# Altium footprint library Lib_001.PcbLib: 429 footprints (part 5 of 28)
Each footprint in its own frame and in the unit in brackets; x right, y up, seen from the top. Pads: shape width x height; smd on the part's side, far side on the other; paste and mask are expansions set on the pad; w line width, h text height; cw(c..) or ccw(c..) is an arc to the next point about the centre after c.
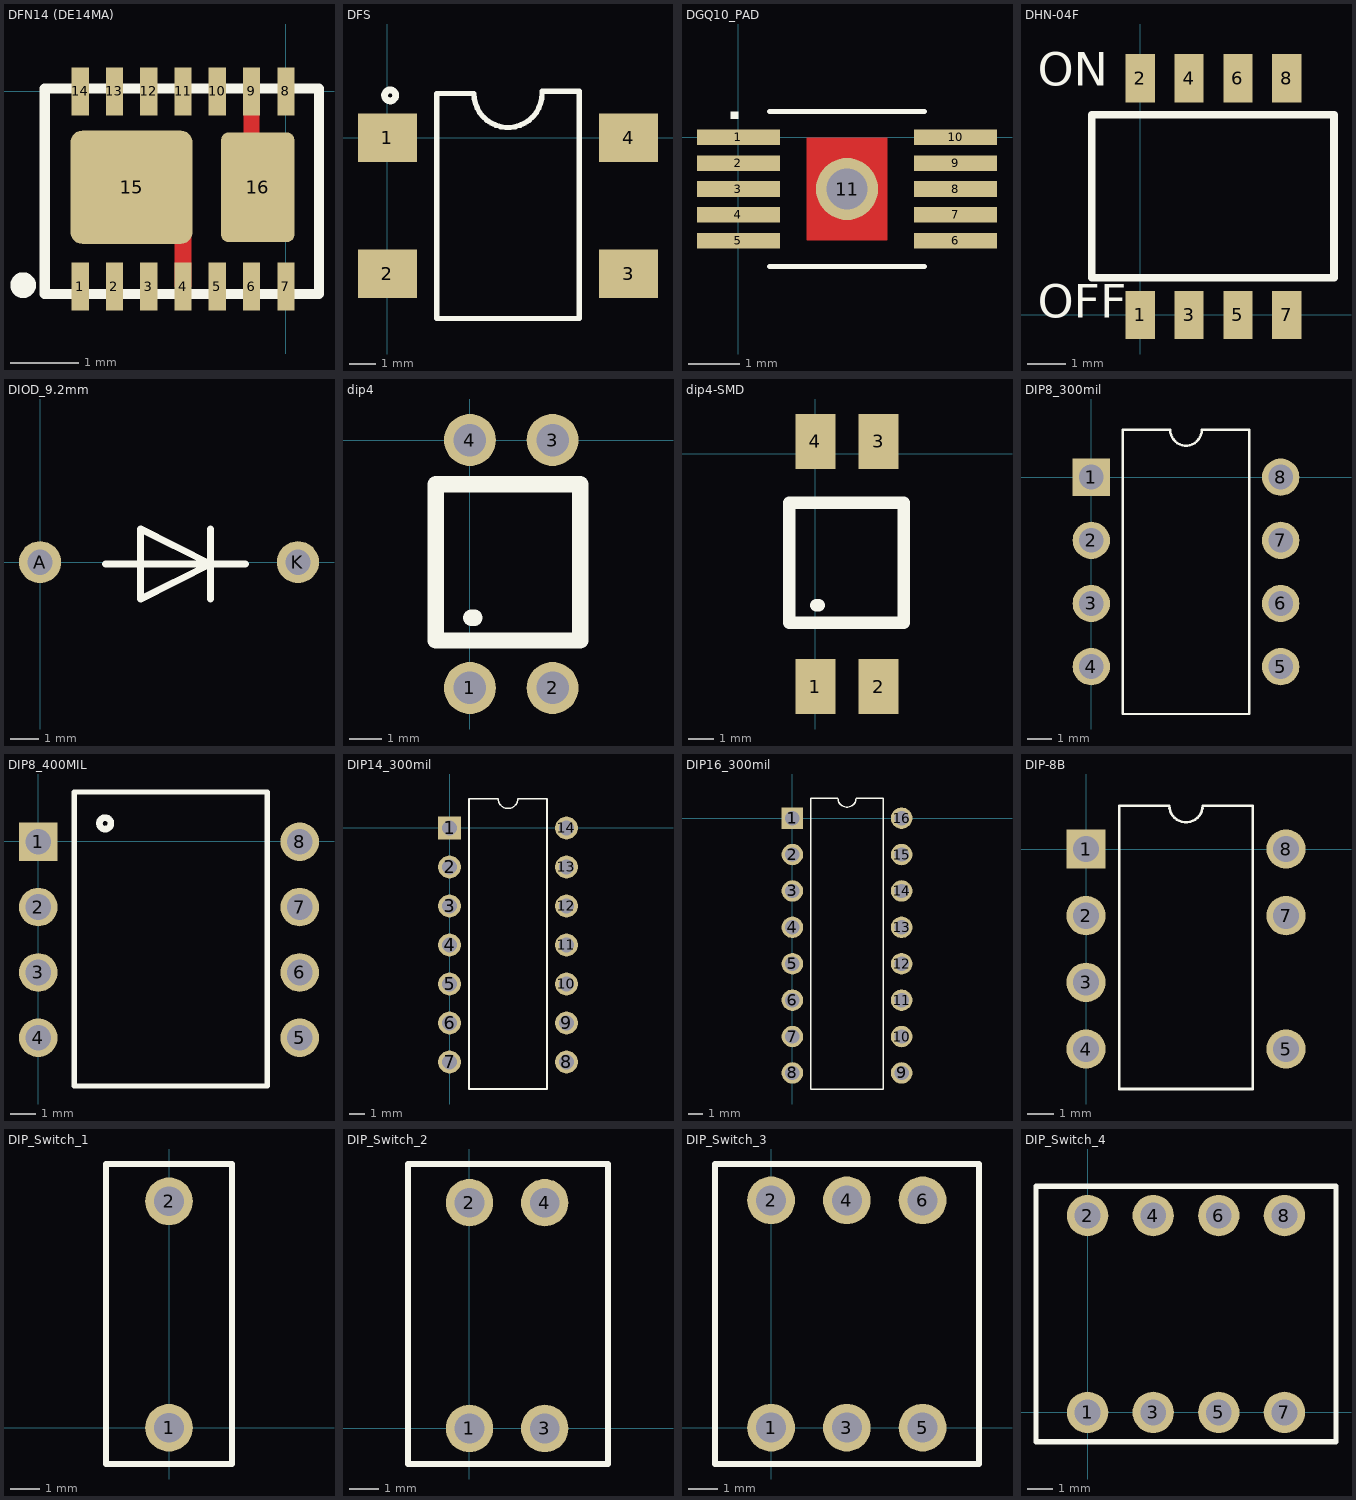
[diagram p4: the footprints below, top view; thin cyan lines are the x and y axes]

## DFN14 (DE14MA) [mm] "DE14MA PACKAGE  14-LEAD (4mm   ?   3mm) PLASTIC DFN"
pads (16):
  rect 0.25x0.7 smd: 1(-3,-2.85) 2(-2.5,-2.85) 3(-2,-2.85) 4(-1.5,-2.85) 5(-1,-2.85) 6(-0.5,-2.85) 7(0,-2.85) 8(0,0) 9(-0.5,0) 10(-1,0) 11(-1.5,0) 12(-2,0) 13(-2.5,0) 14(-3,0)
  rrect20% 1.78x1.65 smd paste+0: 15(-2.251,-1.4)
  rrect20% 1.07x1.6 smd: 16(-0.41,-1.4)
Top Layer:
  region: -0.84,-0.62 -0.611,-0.62 -0.611,0 -0.389,0 -0.389,-0.788 -0.844,-0.788 -0.844,-0.771
  region: -1.381,-2.85 -1.381,-1.898 -1.719,-1.898 -1.719,-2.151 -1.617,-2.151 -1.617,-2.85
Top Overlay:
  lines w0.15: -3.516,-2.958 0.484,-2.958 0.484,0.042 -3.516,0.042 -3.516,-2.958
  lines w0.254: -3.878,-2.788 ccw(c-3.833,-2.828) -3.868,-2.779
3D body: height 0.5, standoff 0, extent -3.126,-0.137 -2.876,0.043
3D body: height 0.5, standoff 0, extent -2.625,-0.137 -2.375,0.043
3D body: height 0.5, standoff 0, extent -2.126,-0.137 -1.876,0.043
3D body: height 0.5, standoff 0, extent -1.625,-0.137 -1.375,0.043
3D body: height 0.5, standoff 0, extent -1.124,-0.137 -0.874,0.043
3D body: height 0.5, standoff 0, extent -0.624,-0.137 -0.374,0.043
3D body: height 0.5, standoff 0, extent -0.126,-0.137 0.124,0.043
3D body: height 0.5, standoff 0, extent -0.125,-2.967 0.125,-2.787
3D body: height 0.5, standoff 0, extent -0.625,-2.967 -0.375,-2.787
3D body: height 0.5, standoff 0, extent -1.125,-2.966 -0.875,-2.786
3D body: height 0.5, standoff 0, extent -1.625,-2.967 -1.375,-2.787
3D body: height 0.5, standoff 0, extent -2.125,-2.967 -1.875,-2.787
3D body: height 0.5, standoff 0, extent -2.625,-2.967 -2.375,-2.787
3D body: height 0.5, standoff 0, extent -3.125,-2.967 -2.875,-2.787
3D body: height 1, standoff 0, extent -3.516,-2.958 0.484,0.042

## DFS [mm] "Bridge Rectifiers"
pads (4):
  rect 2.2x1.8 smd: 1(0,0) 2(0,-5.08) 3(9,-5.08) 4(9,0)
Top Overlay:
  lines w0.2: 5.77,1.65 cw(c4.5,1.65) 3.23,1.65 1.835,1.65 1.835,-6.75 7.165,-6.75 7.165,1.73 5.77,1.73
  lines w0.254: 0.306,1.603 ccw(c0.1,1.58) 0.307,1.57
3D body "User Library-DFS.STEP": height 2.61, standoff 0.02, extent -0.62,-6.64 9.68,1.56

## DGQ10_PAD [mm] "MSOP 10 PowerPad"
pads (11):
  rect 1.6x0.3 smd: 1(0,0) 2(0,-0.5) 3(0,-1) 4(0,-1.5) 5(0,-2) 6(4.2,-2) 7(4.2,-1.5) 8(4.2,-1) 9(4.2,-0.5) 10(4.2,0)
  round 1.2 hole 0.8: 11(2.1,-1)
Top Layer:
  rectangle: 1.32,-2 2.88,0
Top Overlay:
  rectangle: -0.15,0.35 0,0.5
  lines w0.1: 0.6,-2.5 3.6,-2.5 ; 0.6,0.5 3.6,0.5
Top Solder:
  rectangle: 1.22,-2.1 2.98,0.1
3D body: height 1.1, standoff 0, extent 0.6,-2.5 3.6,0.5

## DHN-04F [mm]
pads (8):
  rect 0.76x1.25 smd: 1(0,0) 2(0,6.15) 3(1.27,0) 4(1.27,6.15) 5(2.54,0) 6(2.54,6.15) 7(3.81,0) 8(3.81,6.15)
Top Overlay:
  lines w0.2: -1.262,0.964 5.038,0.964 5.038,5.204 -1.262,5.204 -1.262,0.964
  text "ON" at -2.656,5.671 h1.5
  text "OFF" at -2.656,-0.36 h1.5
3D body "User Library-DHN-04F.STEP": height 1.6, standoff 0, extent -1.25,-0.25 5.05,6.45

## DIOD_9.2mm [mm]
pads (2):
  round 1.5 hole 0.9: A(0,0) K(9.2,0)
Top Overlay:
  lines w0.254: 2.33,-0.065 7.33,-0.065 ; 6.08,-1.315 6.08,1.185 ; 3.58,-1.315 3.58,1.185 6.08,-0.065 3.58,-1.315
3D body "User Library-DO-35G-40D.step": height 1.82, standoff -2, extent -0.755,-0.901 9.955,0.901

## dip4 [mm]
pads (4):
  round 1.6 hole 1: 1(0,-7.62) 2(2.54,-7.62) 3(2.54,0) 4(0,0)
Top Overlay:
  lines w0.5: 0.04,-5.46 0.14,-5.46 ; -1.05,-6.16 3.39,-6.16 3.39,-1.36 -1.05,-1.36 -1.05,-6.16
3D body "User Library-DIP-4.step": height 4.3, standoff -3, extent -1.12,-7.77 3.46,0.1

## dip4-SMD [mm]
pads (4):
  rect 1.6x2.2 smd: 1(0,-9.32) 2(2.54,-9.32) 3(2.54,0.5) 4(0,0.5)
Top Overlay:
  lines w0.5: 0.04,-6.06 0.14,-6.06 ; -1.05,-6.76 -1.05,-1.96 3.54,-1.96 3.54,-6.76 -1.05,-6.76
3D body "User Library-FOD817.step": height 4.6, standoff 0, extent -1.3,-9.628 3.8,0.832

## DIP8_300mil [mm]
height 5.08
pads (8):
  rect 1.5x1.5 hole 1: 1(0,0)
  round 1.5 hole 1: 2(0,-2.54) 3(0,-5.08) 4(0,-7.62) 5(7.62,-7.62) 6(7.62,-5.08) 7(7.62,-2.54) 8(7.62,0)
Top Overlay:
  lines w0.1: 1.27,-9.525 6.35,-9.525 6.35,1.905 4.445,1.905 cw(c3.81,1.905) 3.175,1.905 1.27,1.905 1.27,-9.525
3D body "CircuitWorks-DIP8.step": height 4.19, standoff -2.67, extent -0.127,-9.525 7.747,1.905

## DIP8_400MIL [mm] "широкий DIP"
pads (8):
  rect 1.5x1.5 hole 1: 1(0.003,-0.013)
  round 1.5 hole 1: 2(0.003,-2.553) 3(0.003,-5.093) 4(0.003,-7.633) 5(10.16,-7.633) 6(10.16,-5.093) 7(10.16,-2.553) 8(10.16,-0.013)
Top Overlay:
  circle w0.254: c2.6,0.7 r0.224
  lines w0.2: 1.4,-9.499 1.4,1.915 8.9,1.915 8.9,-9.5 1.4,-9.499
3D body "User Library-DIP1016W48P254L1130H520Q8.STEP": height 5.2, standoff -2, extent -0.1,-9.5 10.31,1.8

## DIP14_300mil [mm]
height 5.08
pads (14):
  rect 1.5x1.5 hole 1: 1(0,0)
  round 1.5 hole 1: 2(0,-2.54) 3(0,-5.08) 4(0,-7.62) 5(0,-10.16) 6(0,-12.7) 7(0,-15.24) 8(7.62,-15.24) 9(7.62,-12.7) 10(7.62,-10.16) 11(7.62,-7.62) 12(7.62,-5.08) 13(7.62,-2.54) 14(7.62,0)
Top Overlay:
  lines w0.1: 1.27,-17 1.27,1.905 3.175,1.905 ccw(c3.81,1.905) 4.445,1.905 6.35,1.905 6.35,-17 1.27,-17
3D body "CircuitWorks-DIP-14.step": height 3.61, standoff -3.37, extent -0.25,-17.075 7.75,1.975

## DIP16_300mil [mm]
height 5.08
pads (16):
  rect 1.5x1.5 hole 1: 1(0,0)
  round 1.5 hole 1: 2(0,-2.54) 3(0,-5.08) 4(0,-7.62) 5(0,-10.16) 6(0,-12.7) 7(0,-15.24) 8(0,-17.78) 9(7.62,-17.78) 10(7.62,-15.24) 11(7.62,-12.7) 12(7.62,-10.16) 13(7.62,-7.62) 14(7.62,-5.08) 15(7.62,-2.54) 16(7.62,0)
Top Overlay:
  lines w0.1: 1.27,-18.9 6.35,-18.9 6.35,1.4 4.445,1.4 cw(c3.81,1.4) 3.175,1.4 1.27,1.4 1.27,-18.9
3D body "CircuitWorks-DIP 16 IC.step": height 5.1, standoff -3.3, extent -0.2,-18.7 7.67,1.3

## DIP-8B [mm]
height 5.08
pads (7):
  rect 1.5x1.5 hole 1: 1(0,0)
  round 1.5 hole 1: 2(0,-2.54) 3(0,-5.08) 4(0,-7.62) 5(7.62,-7.62) 7(7.62,-2.54) 8(7.62,0)
Top Overlay:
  lines w0.1: 1.27,-9.144 6.35,-9.144 6.35,1.651 4.445,1.651 cw(c3.81,1.651) 3.175,1.651 1.27,1.651 1.27,-9.144
3D body "CircuitWorks-DIP8.step": height 4.19, standoff -2.67, extent -0.127,-9.525 7.747,1.905

## DIP_Switch_1 [mm] "DS1040-01"
pads (2):
  round 1.6 hole 1: 1(0,0) 2(0,7.62)
Top Overlay:
  lines w0.2: -2.125,-1.22 -2.125,8.875 2.125,8.875 2.125,-1.22 -2.125,-1.22
3D body "DS1040-01.stp": height 6.8, standoff -3.85, extent -1.995,-1.125 2.005,8.775

## DIP_Switch_2 [mm]
pads (4):
  round 1.6 hole 1: 1(0,0) 2(0,7.62) 3(2.54,0) 4(2.54,7.62)
Top Overlay:
  lines w0.2: -2.075,-1.2 -2.075,8.925 4.675,8.925 4.675,-1.2 -2.075,-1.2
3D body "DS1040-02.stp": height 6.8, standoff -3.85, extent -1.975,-1.1 4.565,8.8

## DIP_Switch_3 [mm]
pads (6):
  round 1.6 hole 1: 1(0,0) 2(0,7.62) 3(2.54,0) 4(2.54,7.62) 5(5.08,0) 6(5.08,7.62)
Top Overlay:
  lines w0.2: -1.88,-1.22 -1.88,8.84 6.97,8.84 6.97,-1.22 -1.88,-1.22
3D body "User Library-switch 3.step": height 7, standoff -3.7, extent -1.75,-1.12 6.384,8.78

## DIP_Switch_4 [mm]
pads (8):
  round 1.6 hole 1: 1(0,0) 2(0,7.62) 3(2.54,0) 4(2.54,7.62) 5(5.08,0) 6(5.08,7.62) 7(7.62,0) 8(7.62,7.62)
Top Overlay:
  lines w0.2: -2,-1.14 -2,8.76 9.62,8.76 9.62,-1.14 -2,-1.14
3D body "User Library-DS1040-04 (DIP_switch).STEP": height 6.8, standoff -3.85, extent -2,-1.14 9.62,8.76